# Altium footprint library ThanhNT.PcbLib: 579 footprints (part 9 of 37)
Each footprint in its own frame and in the unit in brackets; x right, y up, seen from the top. Pads: shape width x height; smd on the part's side, far side on the other; paste and mask are expansions set on the pad; w line width, h text height; cw(c..) or ccw(c..) is an arc to the next point about the centre after c.
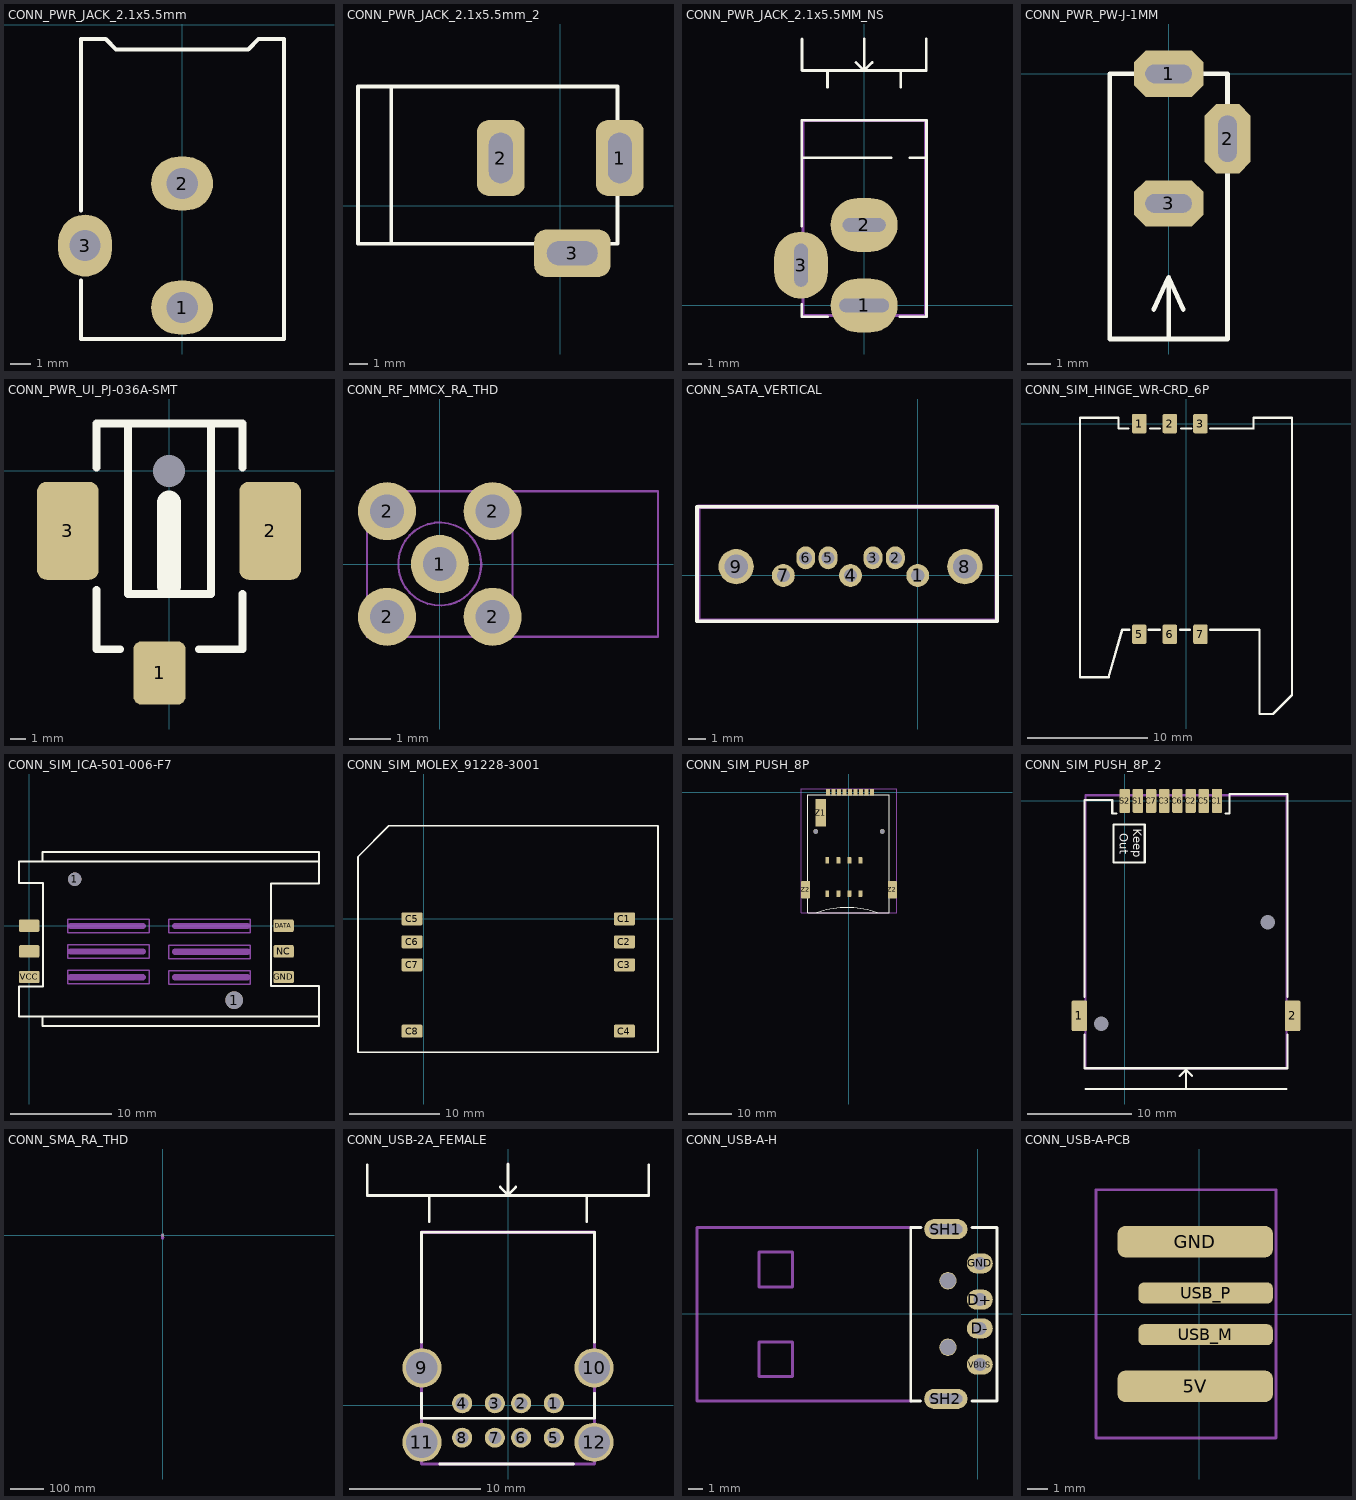
[diagram p8: the footprints below, top view; thin cyan lines are the x and y axes]

## CONN_PWR_JACK_2.1x5.5mm [mm] "Power Connector, 2.1mm ID, 5.5mm OD"
height 11
pads (3):
  oval 3x2.6 hole 1.511: 1(0,-13.7) 2(0,-7.7)
  oval 2.6x3 hole 1.511: 3(-4.7,-10.7)
Top Overlay:
  lines w0.2: -4.9,-12.4 -4.9,-15.225 4.925,-15.225 4.925,-0.7 3.7,-0.7 3.2,-1.2 -3.2,-1.2 -3.7,-0.7 -4.9,-0.7 -4.9,-9
Mechanical 13:
  lines w0.076: -4.9,-12.4 -4.9,-15.225 4.925,-15.225 4.925,-0.7 3.7,-0.7 3.2,-1.2 -3.2,-1.2 -3.7,-0.7 -4.9,-0.7 -4.9,-9
3D body "3100-522 Connector.stp": height 11, standoff -3.5, extent -4.9,-14.1 4.5,0

## CONN_PWR_JACK_2.1x5.5mm_2 [mil] "Jac DC input"
height 200
pads (3):
  rrect50% 100x160 hole 50 slot 106.3 at 90 deg: 1(125,100) 2(-125,100)
  rrect50% 160x100 hole 50 slot 106.3 at 0 deg: 3(25,-100)
Top Overlay:
  lines w7.87: -355,-80 -355,250 ; -425,-80 120,-80 120,250 -425,250 -425,-80
3D body "SW3dPS-dc range - dc connector[4840.2201].STEP": height 433.67, standoff -137.2, extent -410.35,-105.12 134,269.12

## CONN_PWR_JACK_2.1x5.5MM_NS [mm]
pads (3):
  oval 5x4 hole 1 slot 3.7 at 0 deg: 1(0,0)
  oval 5x4 hole 1 slot 3.2 at 0 deg: 2(0,6)
  oval 4x5 hole 1 slot 3.2 at 90 deg: 3(-4.7,3)
Top Overlay:
  lines w0.2: -4.65,0.1 -4.65,-0.85 -2.7,-0.85 ; -4.65,5.9 -4.65,13.8 4.65,13.8 4.65,-0.85 2.65,-0.85 ; -4.65,11 2,11 ; -4.625,19.85 -4.625,17.5 4.625,17.5 4.625,19.85 ; -2.725,16.25 -2.725,17.5 ; -0.6,18.1 0,17.5 ; 0,19.85 0,17.5 ; 0.6,18.1 0,17.5 ; 2.725,16.25 2.725,17.5 ; 3.4,11 4.65,11
Mechanical 16:
  lines w0.2: -4.55,-0.75 4.55,-0.75 4.55,13.75 -4.55,13.75 -4.55,-0.75
3D body "CUI-PJ-002AH.step": height 11.02, standoff -3.48, extent -4.9,-0.7 4.5,13.7

## CONN_PWR_PW-J-1MM [mm] "Power Header 1mm"
pads (3):
  oct 3x2 hole 0.8 slot 2 at 0 deg paste+1: 1(0,0) 3(0,-5.588)
  oct 2x3 hole 0.8 slot 2 at 90 deg paste+1: 2(2.54,-2.794)
Top Overlay:
  lines w0.2: -0.635,-10.16 0,-8.763 ; 0,-11.43 0,-8.763 ; 0.635,-10.16 0,-8.763 ; -2.54,-11.43 -2.54,0 2.54,0 2.54,-11.43 -2.54,-11.43

## CONN_PWR_UI_PJ-036A-SMT [mm]
pads (4):
  rrect30% 3.3x4 smd: 1(-0.6,-12.8)
  rrect30% 3.9x6.2 smd: 2(6.4,-3.8) 3(-6.4,-3.8)
  rrect30% 0x0 hole 2.032 unplated: 4(0,0)
Top Overlay:
  lines w0.5: -4.6,-7.55 -4.6,-11.3 -3.1,-11.3 ; -4.6,0.2 -4.6,3 4.65,3 4.65,0.2 ; -2.6,3 -2.6,-7.8 2.65,-7.8 2.65,2.9 ; 1.9,-11.3 4.65,-11.3 4.65,-7.8
  lines w1.5: 0,-7.3 0,-2
3D body "CUI-PJ-036A-SMT.step": height 11.09, standoff -1.51, extent -7.5,-14.1 7.7,3

## CONN_RF_MMCX_RA_THD [mil] "RF connector, right-angle THD, TE 1-1634010-0 or TE 1408151"
height 149.61
pads (5):
  round 55 hole 32: 1(0,0) 2(-50,-50) 2(-50,50) 2(50,-50) 2(50,50)
Mechanical 13:
  circle w1.97: c-0.09,0.01 r39.37
  circle w1.97: c0,0 r13.78
  lines w1.97: -68.9,-39.37 -39.37,-39.37 -39.37,-68.9 ; -68.9,39.37 -39.37,39.37 -39.37,68.9 ; -38.07,-9.54 ccw(c-3.54,-2.06) -29.28,-26.26 ; 9.57,-38.16 ccw(c1.62,-3.49) 26.2,-29.2 ; 29.21,26.34 cw(c3.99,2.19) 38.14,9.49 ; 37.1,-13.16 ccw(c4.48,-1.02) 39.27,-2.07 ; 39.37,-68.9 39.37,-39.37 68.9,-39.37 ; 39.37,68.9 39.37,39.37 68.9,39.37 ; 68.9,-68.9 68.9,68.9 ; -68.9,-68.9 -68.9,68.9 206.69,68.9 206.69,-68.9 -68.9,-68.9 ; -59.84,-59.84 -59.84,-40.16 -40.16,-40.16 -40.16,-59.84 -59.84,-59.84 ; -59.84,40.16 -59.84,59.84 -40.16,59.84 -40.16,40.16 -59.84,40.16 ; 40.16,-59.84 59.84,-59.84 59.84,-40.16 40.16,-40.16 40.16,-59.84 ; 40.16,40.16 59.84,40.16 59.84,59.84 40.16,59.84 40.16,40.16
3D body "MMCX connector 1408151-1.STEP": height 149.61, standoff -118.11, extent -68.89,-68.89 206.7,68.9

## CONN_SATA_VERTICAL [mm]
pads (9):
  round 1.3 hole 0.74: 1(0,0) 4(-3.81,0) 7(-7.62,0)
  oval 1.07x1.3 hole 0.74: 2(-1.27,1) 3(-2.54,1) 5(-5.08,1) 6(-6.35,1)
  round 2 hole 1.35: 8(2.67,0.5) 9(-10.29,0.5)
Top Overlay:
  lines w0.2: -12.51,-2.6 -12.51,3.9 4.49,3.9 4.49,-2.6 -12.51,-2.6
Mechanical 16:
  lines w0.254: -12.43,-2.555 -12.43,3.895 4.47,3.895 4.47,-2.555 -12.43,-2.555
3D body "471554001.stp": height 8.43, standoff -2.62, extent -12.43,-2.555 4.47,3.895

## CONN_SIM_HINGE_WR-CRD_6P [mm] "WR-CRD mini SIM_Hinge type_6 pins_with cover shell_Housing Height 1.80mm (SK10 - Minh Ha)"
height 1.8
pads (6):
  rrect20% 1.2x1.6 smd: 1(-3.9,0) 2(-1.36,0) 3(1.18,0) 5(-3.9,-17.48) 6(-1.36,-17.48) 7(1.18,-17.48)
Top Overlay:
  lines w0.2: -4.81,-0.4 -5.62,-0.4 -5.62,0.5 -8.82,0.5 -8.82,-21.05 -6.449,-21.05 -5.325,-17.093 -4.707,-17.093 ; -3.1,-17.1 -2.2,-17.1 ; -3,-0.4 -2.2,-0.4 ; -0.5,-17.1 0.3,-17.1 ; -0.4,-0.4 0.4,-0.4 ; 2,-17.1 6.08,-17.1 6.08,-24.1 7.2,-24.1 8.78,-22.52 8.78,0.5 5.58,0.5 5.58,-0.4 ; 2,-0.4 5.58,-0.4 ; 5.58,-0.4 5.58,-0.4
3D body "693012040811.stp": height 1.85, standoff 0, extent -8.82,-24.1 8.78,0.5

## CONN_SIM_ICA-501-006-F7 [mil] "(SK06 - Minh Ha)"
pads (8):
  round 52 hole 52: 1(178,182)
  round 69 hole 69: 1(800,-290.55)
  rrect20% 79x48 smd: CLOCK(0,0) DATA(993,0) GND(993,-200) NC(993,-100) RESET(0,-100) VCC(0,-200)
Top Overlay:
  lines w7.87: -39.76,-355.12 -39.76,-237.01 52,-237.01 ; -39.37,-355.12 52,-355.12 ; 52,166 -38.98,166 -38.98,250 1131,250 ; 52,251 52,287 1131,287 1131,250 ; 53,-236.61 53,166 ; 1131,-354.72 1131,-235.43 943,-235.43 943,165 1131,165 1131,250 ; 52,-355.12 1131,-355.12 1131,-390.55 52,-390.55 52,-355.12
Mechanical 2:
Mechanical 4:
Mechanical 16:
  lines w5: 150,-226.38 150,-174.41 468,-174.41 468,-226.38 150,-226.38 ; 150,-126.38 150,-74.41 468,-74.41 468,-126.38 150,-126.38 ; 150,-26.77 150,26 469,26 469,-26.77 150,-26.77 ; 544,-227.56 544,-175.59 862,-175.59 862,-227.56 544,-227.56 ; 545,-127.95 545,-75.98 863,-75.98 863,-127.95 545,-127.95 ; 545,-27.95 545,25 863,25 863,-27.95 545,-27.95
  lines w24: 161,-200.79 443,-200.79 ; 161,-100.79 443,-100.79 ; 162,-1.18 444,-1.18 ; 569,-201.18 851,-201.18 ; 569,-101.57 852,-101.57 ; 569,-1.57 852,-1.57
3D body "User Library-SIM5060-6-0-26-01-A.STEP": height 112.36, standoff -17.56, extent -28.86,-390.58 1138.07,286.58

## CONN_SIM_MOLEX_91228-3001 [mil]
pads (8):
  rrect20% 91x56 smd: C1(874,0) C2(874,-100) C3(874,-200) C4(874,-488.19) C5(-50,0) C6(-50,-100) C7(-50,-200) C8(-50,-488.19)
Top Overlay:
  lines w7.87: 1019,-580 -285,-580 -285,269.8 -150.47,405 1020,405 1020,-580
Mechanical 2:
Mechanical 4:
3D body "6570.stp": height 118.11, standoff -27.56, extent -289.72,-577.12 1025.24,407.13

## CONN_SIM_PUSH_8P [mm] "WR-CRD Mega SIM_Push and Push_8 pins_with Card Detection_Housing Height 1.50mm"
height 1.5
pads (22):
  rrect20% 0.9x1.5 smd: CD(-4.835,0) P1(5.325,0) P2(2.785,0) P3(0.245,0) P4(-2.295,0) P5(4.055,0) P6(1.515,0) P7(-1.025,0) P8(-3.565,0) ""(-4.995,-23.3) ""(-4.995,-15.7) ""(-2.455,-23.3) ""(-2.455,-15.7) ""(0.085,-23.3) ""(0.085,-15.7) ""(2.625,-23.3) ""(2.625,-15.7)
  rrect20% 2.5x6.35 smd: Z1(-6.5,-4.725)
  rrect20% 2x4.1 smd: Z2(-10,-22.43) Z2(10,-22.43)
  round 1.1 hole 1.1 unplated: ""(-7.65,-9) ""(7.65,-9)
Top Overlay:
  lines w0.2: -7.409,-27.744 cw(c-0.459,-47.419) 6.45,-27.73 ; -9.45,-27.73 -9.45,-0.63 9.25,-0.63 9.25,-27.73 -9.45,-27.73
Mechanical 15:
  lines w0.127: -11,-27.73 11,-27.73 11,0.75 -11,0.75 -11,-27.73
3D body "693013050811.stp": height 1.5, standoff -0.5, extent -10.6,-27.73 10.4,0.33

## CONN_SIM_PUSH_8P_2 [mm]
pads (12):
  rrect20% 1.5x2.95 smd: 1(-4.37,-20.7) 2(16.18,-20.7)
  rrect70% 0x0 hole 1.4: 3(-2.26,-21.47) 4(13.79,-11.67)
  rrect20% 1x2.3 smd mask+0.051: C1(8.89,0) C2(6.35,0) C3(3.81,0) C5(7.62,0) C6(5.08,0) C7(2.54,0) S1(1.27,0) S2(0,0)
Top Overlay:
  lines w0.2: -3.87,-22.5 -3.87,-25.75 15.68,-25.75 15.68,-22.5 ; -3.87,-18.9 -3.87,0.1 -1.2,0.1 -1.2,-1.2 -0.8,-1.2 ; -3.77,-27.75 15.58,-27.75 ; 5.3,-26.5 5.9,-25.9 ; 5.9,-27.75 5.9,-25.9 ; 6.5,-26.5 5.9,-25.9 ; 9.71,-1.19 10.1,-1.19 10.1,0.65 15.68,0.65 15.68,-18.9 ; -1.07,-5.95 1.93,-5.95 1.93,-2.25 -1.07,-2.25 -1.07,-5.95
  text "Out" at -0.5,-3.1 h0.8
  text "Keep" at 0.8,-2.7 h0.8
Mechanical 16:
  lines w0.2: -3.77,-25.75 15.58,-25.75 15.58,0.55 -3.77,0.55 -3.77,-25.75
3D body "475531001.stp": height 1.8, standoff -0.7, extent -4.6,-25.95 16.35,0.55

## CONN_SMA_RA_THD [mm]
height 10.43
pads (5):
  round 2.5 hole 1.5: 1(0,0)
  round 2.5 hole 1.6: 2(-2.54,-2.54) 2(-2.54,2.54) 2(2.54,-2.54) 2(2.54,2.54)
Mechanical 13:
  drawing of 402 lines, arcs and shapes, not listed
3D body "SMA Conn TE 5-1814400-1.STEP": height 10.43, standoff -3.41, extent -3.173,-11.05 3.167,3.15

## CONN_USB-2A_FEMALE [mm]
pads (12):
  round 1.524 hole 1: 1(3.5,0.155) 2(1,0.155) 3(-1,0.155) 4(-3.5,0.155) 5(3.5,-2.465) 6(1,-2.465) 7(-1,-2.465) 8(-3.5,-2.465)
  round 3 hole 2.4: 9(-6.57,2.865) 10(6.57,2.865) 11(-6.57,-2.815) 12(6.57,-2.815)
Top Overlay:
  lines w0.2: -10.75,18.375 -10.75,16.025 10.75,16.025 10.75,18.375 ; -6.6,0.925 -6.6,-0.975 6.6,-0.975 6.6,0.925 ; -6.6,4.825 -6.6,13.225 6.6,13.225 6.6,4.825 ; -6,14.025 -6,16.025 ; -5.2,-4.475 5,-4.475 ; -0.6,16.675 0,16.075 ; 0,18.425 0,16.075 ; 0.6,16.675 0,16.075 ; 6,14.025 6,16.025
Mechanical 16:
  lines w0.254: -6.6,-4.475 6.6,-4.475 6.6,13.225 -6.6,13.225 -6.6,-4.475
3D body "c-5787617-1-c-3d.stp": height 15.78, standoff -4.37, extent -8.1,-4.075 8.139,13.105

## CONN_USB-A-H [mm]
pads (8):
  oval 1.8x1.4 hole 0.9: D+(0.131,0.975) D-(0.131,-1.025) GND(0.131,3.475) VBUS(0.131,-3.525)
  round 1.2 hole 1.1: HOLE(-2.079,-2.325) HOLE(-2.079,2.275)
  oval 3x1.4 hole 0.7 slot 2.3 at 0 deg: SH1(-2.219,5.85) SH2(-2.219,-5.9)
Top Overlay:
  lines w0.2: -3.988,-6.045 -4.648,-6.045 -4.648,5.969 -3.937,5.969 ; -0.406,-6.045 1.321,-6.045 1.321,5.969 -0.406,5.969
Mechanical 16:
  lines w0.203: -4.648,-6.051 -19.448,-6.051 -19.448,5.969 -4.648,5.969 ; -15.148,-4.351 -15.148,-1.951 -12.848,-1.951 -12.848,-4.351 -15.148,-4.351 ; -15.148,1.854 -15.148,4.267 -12.848,4.267 -12.848,1.854 -15.148,1.854
3D body "Samtec-USB-AM-S-F-B-TH-FlashDrive.step": height 2.18, standoff -3.52, extent -19.749,-6.276 0.281,6.224

## CONN_USB-A-PCB [mil]
pads (4):
  rrect50% 296x60 smd: 5V(-7.87,-137.8) GND(-7.87,138)
  rrect50% 256x40 smd: USB_M(12,-39.37) USB_P(12,40)
Mechanical 16:
  lines w5: -196.85,-236.22 -196.85,237 146,237 146,-236.22 -196.85,-236.22